# Altium footprint library USB_PD_PSU.PcbLib: 47 footprints (part 1 of 3)
Each footprint in its own frame and in the unit in brackets; x right, y up, seen from the top. Pads: shape width x height; smd on the part's side, far side on the other; paste and mask are expansions set on the pad; w line width, h text height; cw(c..) or ccw(c..) is an arc to the next point about the centre after c.
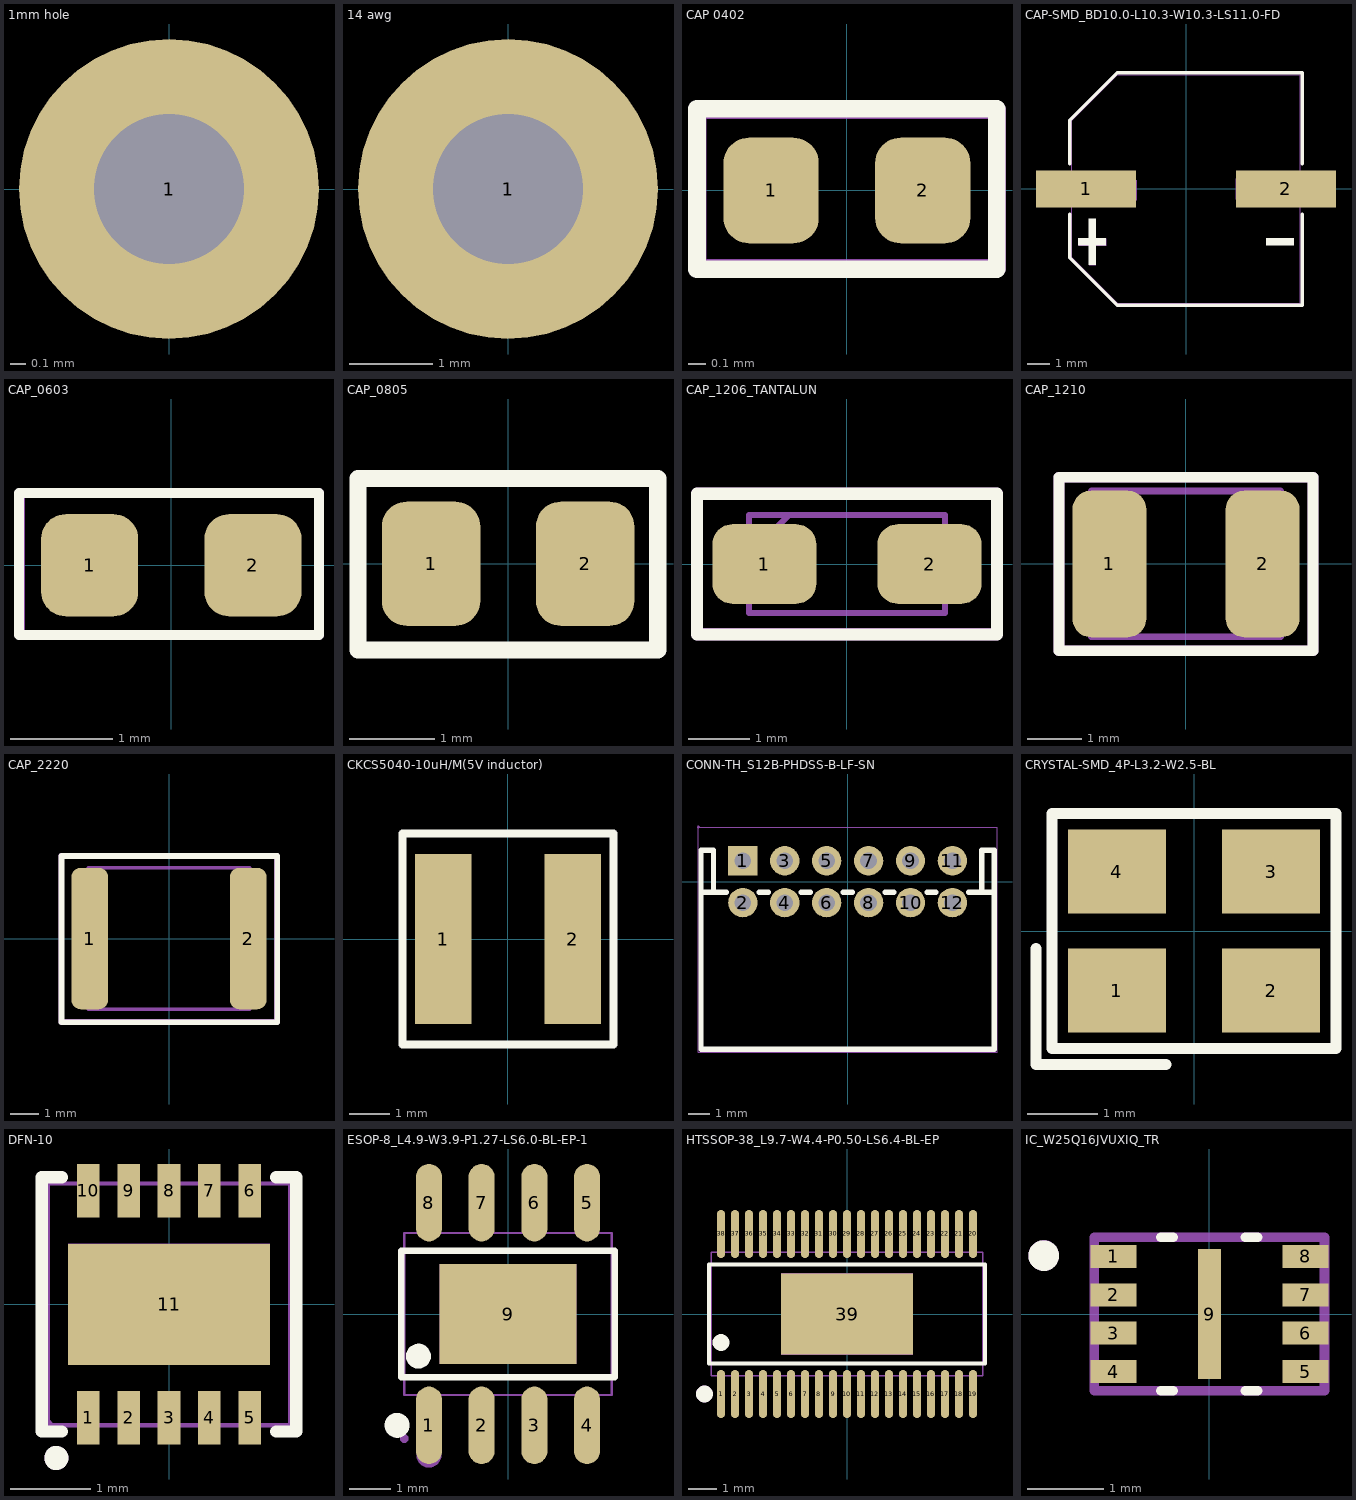
[diagram p0: the footprints below, top view; thin cyan lines are the x and y axes]

## 1mm hole [mm]
pads (1):
  round 2 hole 1: 1(0,0)

## 14 awg [mm]
pads (1):
  round 3.6 hole 1.8: 1(0,0)

## CAP 0402 [mm]
pads (2):
  rrect53% 0.54x0.6 smd: 1(-0.43,0) 2(0.43,0)
Top Overlay:
  lines w0.1: -0.85,-0.447 0.85,-0.447 0.85,0.464 -0.85,0.464 -0.85,-0.447
Top Assembly:
  lines w0.1: -0.846,-0.439 0.851,-0.439 0.851,0.456 -0.846,0.456 -0.846,-0.439
  text ".Designator" at -0.846,-0.251 h1
3D body "step_temp.STEP": height 0.55, standoff 0, extent -0.5,-0.25 0.5,0.25

## CAP-SMD_BD10.0-L10.3-W10.3-LS11.0-FD [mm]
pads (2):
  rect 4.5x1.65 smd: 1(-4.5,0) 2(4.5,0)
Top Overlay:
  region: 4.841,-2.215 4.841,-2.524 3.605,-2.524 3.605,-2.215
  region: -4.841,-2.215 -4.841,-2.524 -3.605,-2.524 -3.605,-2.215
  region: -4.378,-1.339 -4.378,-3.399 -4.069,-3.399 -4.069,-1.339
  lines w0.152: -5.226,-1.143 -5.226,-3.09 -3.09,-5.226 5.226,-5.226 5.226,-1.143 ; -5.226,1.143 -5.226,3.09 -3.09,5.226 5.226,5.226 5.226,1.143
Top Assembly:
  region: 2.25,0.45 5.5,0.45 5.5,-0.45 2.25,-0.45
  region: -5.47,0.403 -2.22,0.403 -2.22,-0.497 -5.47,-0.497
  region: -4.828,-2.243 -4.828,-2.552 -3.592,-2.552 -3.592,-2.243
  region: -4.365,-1.368 -4.365,-3.428 -4.056,-3.428 -4.056,-1.368
  lines w0.051: -5.15,-3.09 -5.15,3.09 -3.09,5.15 5.15,5.15 5.15,-5.15 -3.09,-5.15 -5.15,-3.09
  text "'.Designator'" at -0.259,1.403 h0.5
Mechanical 6:
  region: 4.841,0.154 4.841,-0.155 3.605,-0.155 3.605,0.154
3D body "A768MS477M1ELAV017.step": height 13.2, standoff 0, extent -5.512,-5.08 5.688,5.42

## CAP_0603 [mm]
pads (2):
  rrect50% 0.95x1 smd mask+0.102: 1(-0.8,0) 2(0.8,0)
Top Overlay:
  lines w0.1: -1.493,-0.682 1.446,-0.682 1.446,0.709 -1.493,0.709 -1.493,-0.682
Top Assembly:
  lines w0.1: -1.484,-0.684 -1.484,0.709 1.447,0.709 1.447,-0.684 -1.484,-0.684
  text ".Designator" at -0.883,-0.197 h1
3D body "User Library-Chip Capacitor2.x_b": height 0.86, standoff 0, extent -0.8,-0.4 0.8,0.4

## CAP_0805 [mm]
pads (2):
  rrect50% 1.15x1.45 smd: 1(-0.9,0) 2(0.9,0)
Top Overlay:
  lines w0.2: -1.753,-1.006 1.747,-1.006 1.747,0.994 -1.753,0.994 -1.753,-1.006
Top Assembly:
  lines w0.1: -1.75,-1 1.75,-1 1.75,1 -1.75,1 -1.75,-1
  text ".Designator" at -1.4,-0.111 h1
3D body "User Library-CAP0805-1.x_b": height 1.25, standoff 0, extent -0.991,-0.634 1.009,0.616

## CAP_1206_TANTALUN [mm]
pads (2):
  rrect50% 1.7x1.3 smd: 1(-1.35,0) 2(1.35,0)
Top Overlay:
  lines w0.2: -2.45,-1.15 2.45,-1.15 2.45,1.15 -2.45,1.15 -2.45,-1.15
Top Assembly:
  text ".Designator" at -0.322,0.018 h1
Mechanical 13:
  lines w0.1: -1.6,0.15 -0.95,0.8 ; -1.6,-0.8 -1.6,0.8 1.6,0.8 1.6,-0.8 -1.6,-0.8
  lines w0.2: -2.449,-1.149 2.451,-1.149 2.451,1.151 -2.449,1.151 -2.449,-1.149
3D body "TMCMA0J107MTRF.stp": height 1.8, standoff 0, extent -1.7,-0.9 1.7,0.9

## CAP_1210 [mm]
pads (2):
  rrect50% 1.37x2.72 smd: 1(-1.421,0) 2(1.421,0)
Top Overlay:
  lines w0.2: -2.356,-1.609 2.354,-1.609 2.354,1.607 -2.356,1.607 -2.356,-1.609
Top Assembly:
  lines w0.127: -1.75,-1.35 -1.75,1.35 1.75,1.35 1.75,-1.35 -1.75,-1.35
  lines w0.2: -2.355,-1.608 2.355,-1.608 2.355,1.608 -2.355,1.608 -2.355,-1.608
  text ".Designator" at -0.322,-0.109 h1
3D body "step_temp.STEP": height 2.2, standoff 0, extent -1.6,-1.25 1.6,1.25

## CAP_2220 [mm]
height 3.1
pads (2):
  rrect50% 1.3x5 smd: 1(-2.8,0) 2(2.8,0)
Top Overlay:
  lines w0.2: -3.8,-2.955 -3.8,2.917 3.82,2.917 3.82,-2.955 -3.8,-2.955
Top Assembly:
  lines w0.127: -2.85,-2.5 2.85,-2.5 2.85,2.5 -2.85,2.5 -2.85,-2.5
  lines w0.2: -3.81,-2.951 -3.81,2.921 3.81,2.921 3.81,-2.951 -3.81,-2.951
  text ".Designator" at -0.322,-0.109 h1
3D body "User Library-CAPC5750.x_b": height 2.5, standoff 0, extent -2.85,-2.413 2.85,2.587

## CKCS5040-10uH/M(5V inductor) [mm]
height 4
pads (2):
  rect 1.4x4.2 smd: 1(-1.6,0) 2(1.6,0)
Top Overlay:
  lines w0.2: -2.6,-2.6 2.6,-2.6 ; -2.6,-2.6 -2.6,2.6 2.6,2.6 2.6,-2.6 ; -2.6,-2.6 2.6,-2.6
Top Assembly:
  lines w0.1: -2.6,-2.6 -2.6,2.6 2.6,2.6 2.6,-2.6 -2.6,-2.6
  text "'.Designator'" at -0.005,0.006 h0.5
3D body "INDP2523X23N.step": height 4.1, standoff 0, extent -2.6,-2.5 2.6,2.5

## CONN-TH_S12B-PHDSS-B-LF-SN [mm]
pads (12):
  rect 1.4x1.4 hole 0.8: 1(-5,1)
  round 1.4 hole 0.8: 2(-5,-1) 3(-3,1) 4(-3,-1) 5(-1,1) 6(-1,-1) 7(1,1) 8(1,-1) 9(3,1) 10(3,-1) 11(5,1) 12(5,-1)
Top Overlay:
  lines w0.254: -7,-0.5 -5.785,-0.5 ; -6.401,-0.5 -6.401,1.5 -7,1.5 -7,-8 7,-8 7,1.5 6.401,1.5 6.401,-0.5 ; -4.215,-0.5 -3.785,-0.5 ; -2.215,-0.5 -1.785,-0.5 ; -0.215,-0.5 0.215,-0.5 ; 1.785,-0.5 2.215,-0.5 ; 3.785,-0.5 4.215,-0.5 ; 5.785,-0.5 7,-0.5
Top Assembly:
  drawing of 17 lines, arcs and shapes, not listed
  text ".Designator" at -2.105,-3.334 h1
3D body "S12B-PHDSS-B-LF--SN---3DModel-STEP-56544.STEP": height 5, standoff -3, extent -6.779,-8.024 7.121,1.476

## CRYSTAL-SMD_4P-L3.2-W2.5-BL [mm]
pads (4):
  rect 1.4x1.2 smd: 1(-1.1,-0.85) 2(1.1,-0.85) 3(1.1,0.85) 4(-1.1,0.85)
Top Overlay:
  lines w0.152: -2.257,-0.25 -2.257,-1.907 -0.4,-1.907 ; -2.029,-1.678 2.029,-1.678 2.029,1.679 -2.029,1.679 -2.029,-1.678
Top Solder:
  region: -1.54,-1.25 -1.54,-1.275 -1.575,-1.31 -1.625,-1.31 -1.66,-1.275 -1.66,-1.25 -1.66,-1.225 -1.625,-1.19 -1.575,-1.19 -1.54,-1.225 -1.54,-1.25
  lines w0.051: -1.6,-1.25 -1.6,1.25 1.6,1.25 1.6,-1.25 -1.6,-1.25
Top Assembly:
  text ".Designator" at -2.227,1.923 h1
Mechanical 6:
  circle w0.254: c-1.27,-0.889 r0.127
3D body "ABM8-272-T3.STEP": height 0.7, standoff 0, extent -1.6,-1.25 1.6,1.25

## DFN-10 [mm]
pads (11):
  rect 0.28x0.665 smd paste+0 mask+0.05: 1(-1,-1.407) 2(-0.5,-1.407) 3(0,-1.407) 4(0.5,-1.407) 5(1,-1.407) 6(1,1.407) 7(0.5,1.407) 8(0,1.407) 9(-0.5,1.407) 10(-1,1.407)
  rect 2.5x1.5 smd paste+0 mask+0.05: 11(0,0)
Top Overlay:
  circle w0.15: c-1.397,-1.905 r0.075
  lines w0.152: -1.331,-1.576 -1.576,-1.576 -1.576,1.576 -1.331,1.576 ; 1.331,-1.576 1.576,-1.576 1.576,1.576 1.331,1.576
Top Assembly:
  circle w0.15: c-1.397,-1.905 r0.075
  region: -0.12,-1.5 -0.12,-1.1 0.12,-1.1 0.12,-1.5
  region: -0.12,1.5 -0.12,1.1 0.12,1.1 0.12,1.5
  region: 0.38,1.5 0.38,1.1 0.62,1.1 0.62,1.5
  region: -0.62,-1.5 -0.62,-1.1 -0.38,-1.1 -0.38,-1.5
  region: -1.12,-1.5 -1.12,-1.1 -0.88,-1.1 -0.88,-1.5
  region: 0.88,1.5 0.88,1.1 1.12,1.1 1.12,1.5
  region: -1.44,-1.5 -1.44,-1.525 -1.475,-1.56 -1.525,-1.56 -1.56,-1.525 -1.56,-1.5 -1.56,-1.475 -1.525,-1.44 -1.475,-1.44 -1.44,-1.475 -1.44,-1.5
  region: 0.88,-1.5 0.88,-1.1 1.12,-1.1 1.12,-1.5
  region: -1.12,1.5 -1.12,1.1 -0.88,1.1 -0.88,1.5
  region: -0.62,1.5 -0.62,1.1 -0.38,1.1 -0.38,1.5
  region: 0.38,-1.5 0.38,-1.1 0.62,-1.1 0.62,-1.5
  region: -1.25,0.75 1.25,0.75 1.25,-0.75 -1.25,-0.75
  lines w0.051: -1.5,-1.5 -1.5,1.5 1.5,1.5 1.5,-1.5 -1.5,-1.5
  text ".Designator" at -1.846,2.05 h1
3D body "User Library-DFN10(3x3).x_t": height 0.76, standoff 0, extent -1.503,-1.495 1.497,1.507

## ESOP-8_L4.9-W3.9-P1.27-LS6.0-BL-EP-1 [mm]
pads (9):
  oval 0.63x1.865 smd: 1(-1.905,-2.682) 2(-0.635,-2.682) 3(0.635,-2.682) 4(1.905,-2.682) 5(1.905,2.682) 6(0.635,2.682) 7(-0.635,2.682) 8(-1.905,2.682)
  rect 3.3x2.4 smd paste+0 mask+0.05: 9(0,0)
Top Overlay:
  circle w0.3: c-2.159,-1.016 r0.15
  circle w0.3: c-2.672,-2.682 r0.15
  lines w0.152: -2.576,-1.521 2.576,-1.521 2.576,1.521 -2.576,1.521 -2.576,-1.521
Top Assembly:
  region: -2.4,-3 -2.4,-3.041 -2.458,-3.1 -2.541,-3.1 -2.6,-3.041 -2.6,-3 -2.6,-2.959 -2.541,-2.9 -2.458,-2.9 -2.4,-2.959 -2.4,-3
  region: 1.695,2.165 1.695,3 2.115,3 2.115,2.165
  region: -2.115,1.94 -2.115,2.175 -1.695,2.175 -1.695,1.94
  region: -2.115,2.165 -2.115,3 -1.695,3 -1.695,2.165
  region: 1.695,-3 1.695,-2.165 2.115,-2.165 2.115,-3
  region: -2.115,-2.175 -2.115,-1.94 -1.695,-1.94 -1.695,-2.175
  region: -2.115,-3 -2.115,-2.165 -1.695,-2.165 -1.695,-3
  region: 0.425,1.94 0.425,2.175 0.845,2.175 0.845,1.94
  region: 0.425,2.165 0.425,3 0.845,3 0.845,2.165
  region: 1.695,-2.175 1.695,-1.94 2.115,-1.94 2.115,-2.175
  region: 0.425,-2.175 0.425,-1.94 0.845,-1.94 0.845,-2.175
  region: 0.425,-3 0.425,-2.165 0.845,-2.165 0.845,-3
  region: -0.845,1.94 -0.845,2.175 -0.425,2.175 -0.425,1.94
  region: -0.845,2.165 -0.845,3 -0.425,3 -0.425,2.165
  region: -0.845,-2.175 -0.845,-1.94 -0.425,-1.94 -0.425,-2.175
  region: -0.845,-3 -0.845,-2.165 -0.425,-2.165 -0.425,-3
  region: 1.695,1.94 1.695,2.175 2.115,2.175 2.115,1.94
  lines w0.051: -2.5,-1.95 -2.5,1.95 2.5,1.95 2.5,-1.95 -2.5,-1.95
  text ".Designator" at -2.939,-2.227 h1
Mechanical 6:
  circle w0.3: c-1.905,-3.4 r0.15
Mechanical 15:
  region: -1.65,1.2 1.65,1.2 1.65,-1.2 -1.65,-1.2
3D body "LMR38020SDDAR.STEP": height 1.7, standoff 0, extent -2.45,-3 2.45,3

## HTSSOP-38_L9.7-W4.4-P0.50-LS6.4-BL-EP [mm]
pads (39):
  oval 0.3x1.715 smd paste+0 mask+0.05: 1(-4.5,-2.857) 2(-4,-2.857) 3(-3.5,-2.857) 4(-3,-2.857) 5(-2.5,-2.857) 6(-2,-2.857) 7(-1.5,-2.857) 8(-1,-2.857) 9(-0.5,-2.857) 10(0,-2.857) 11(0.5,-2.857) 12(1,-2.857) 13(1.5,-2.857) 14(2,-2.857) 15(2.5,-2.857) 16(3,-2.857) 17(3.5,-2.857) 18(4,-2.857) 19(4.5,-2.857) 20(4.5,2.857) 21(4,2.857) 22(3.5,2.857) 23(3,2.857) 24(2.5,2.857) 25(2,2.857) 26(1.5,2.857) 27(1,2.857) 28(0.5,2.857) 29(0,2.857) 30(-0.5,2.857) 31(-1,2.857) 32(-1.5,2.857) 33(-2,2.857) 34(-2.5,2.857) 35(-3,2.857) 36(-3.5,2.857) 37(-4,2.857) 38(-4.5,2.857)
  rect 4.7x2.9 smd paste+0 mask+0.05: 39(0,0)
Top Overlay:
  circle w0.3: c-4.5,-1.019 r0.15
  circle w0.3: c-5.093,-2.857 r0.15
  lines w0.152: -4.926,-1.772 4.926,-1.772 4.926,1.771 -4.926,1.771 -4.926,-1.772
Top Assembly:
  drawing of 82 lines, arcs and shapes, not listed
  text ".Designator" at -1.743,-0.298 h1
3D body "LM51770DCPR--3DModel-STEP-56544.STEP": height 1.2, standoff 0, extent -4.874,-3.2 4.826,3.2

## IC_W25Q16JVUXIQ_TR [mm]
height 0.6
pads (9):
  rect 0.6x0.3 smd paste-1 mask+0.07: 1(-1.25,0.75) 2(-1.25,0.25) 3(-1.25,-0.25) 4(-1.25,-0.75) 5(1.25,-0.75) 6(1.25,-0.25) 7(1.25,0.25) 8(1.25,0.75)
  rect 0.3x1.7 smd paste-2: 9(0,0)
Top Overlay:
  circle w0.2: c-2.16,0.76 r0.1
  lines w0.127: -0.63,-1 -0.47,-1 ; -0.63,1 -0.47,1 ; 0.47,-1 0.63,-1 ; 0.47,1 0.63,1
Top Paste:
  region: 0.1,-0.6 -0.1,-0.6 -0.1,-0.1 0.1,-0.1
  region: 0.1,0.1 -0.1,0.1 -0.1,0.6 0.1,0.6
  region: 1.65,-0.85 1.1,-0.85 1.1,-0.65 1.65,-0.65
  region: 1.65,-0.35 1.1,-0.35 1.1,-0.15 1.65,-0.15
  region: 1.65,0.15 1.1,0.15 1.1,0.35 1.65,0.35
  region: 1.65,0.65 1.1,0.65 1.1,0.85 1.65,0.85
  region: -1.1,-0.85 -1.65,-0.85 -1.65,-0.65 -1.1,-0.65
  region: -1.1,-0.35 -1.65,-0.35 -1.65,-0.15 -1.1,-0.15
  region: -1.1,0.15 -1.65,0.15 -1.65,0.35 -1.1,0.35
  region: -1.1,0.65 -1.65,0.65 -1.65,0.85 -1.1,0.85
Top Assembly:
  circle w0.2: c-2.159,0.762 r0.1
  lines w0.127: -1.5,-1 1.5,-1 1.5,1 -1.5,1 -1.5,-1
  text ".Designator" at -2.505,1.353 h1
3D body "step_temp.STEP": height 0.6, standoff 0, extent -1.5,-1 1.5,1